# Altium footprint library myLib.PcbLib: 58 footprints (part 4 of 4)
Each footprint in its own frame and in the unit in brackets; x right, y up, seen from the top. Pads: shape width x height; smd on the part's side, far side on the other; paste and mask are expansions set on the pad; w line width, h text height; cw(c..) or ccw(c..) is an arc to the next point about the centre after c.
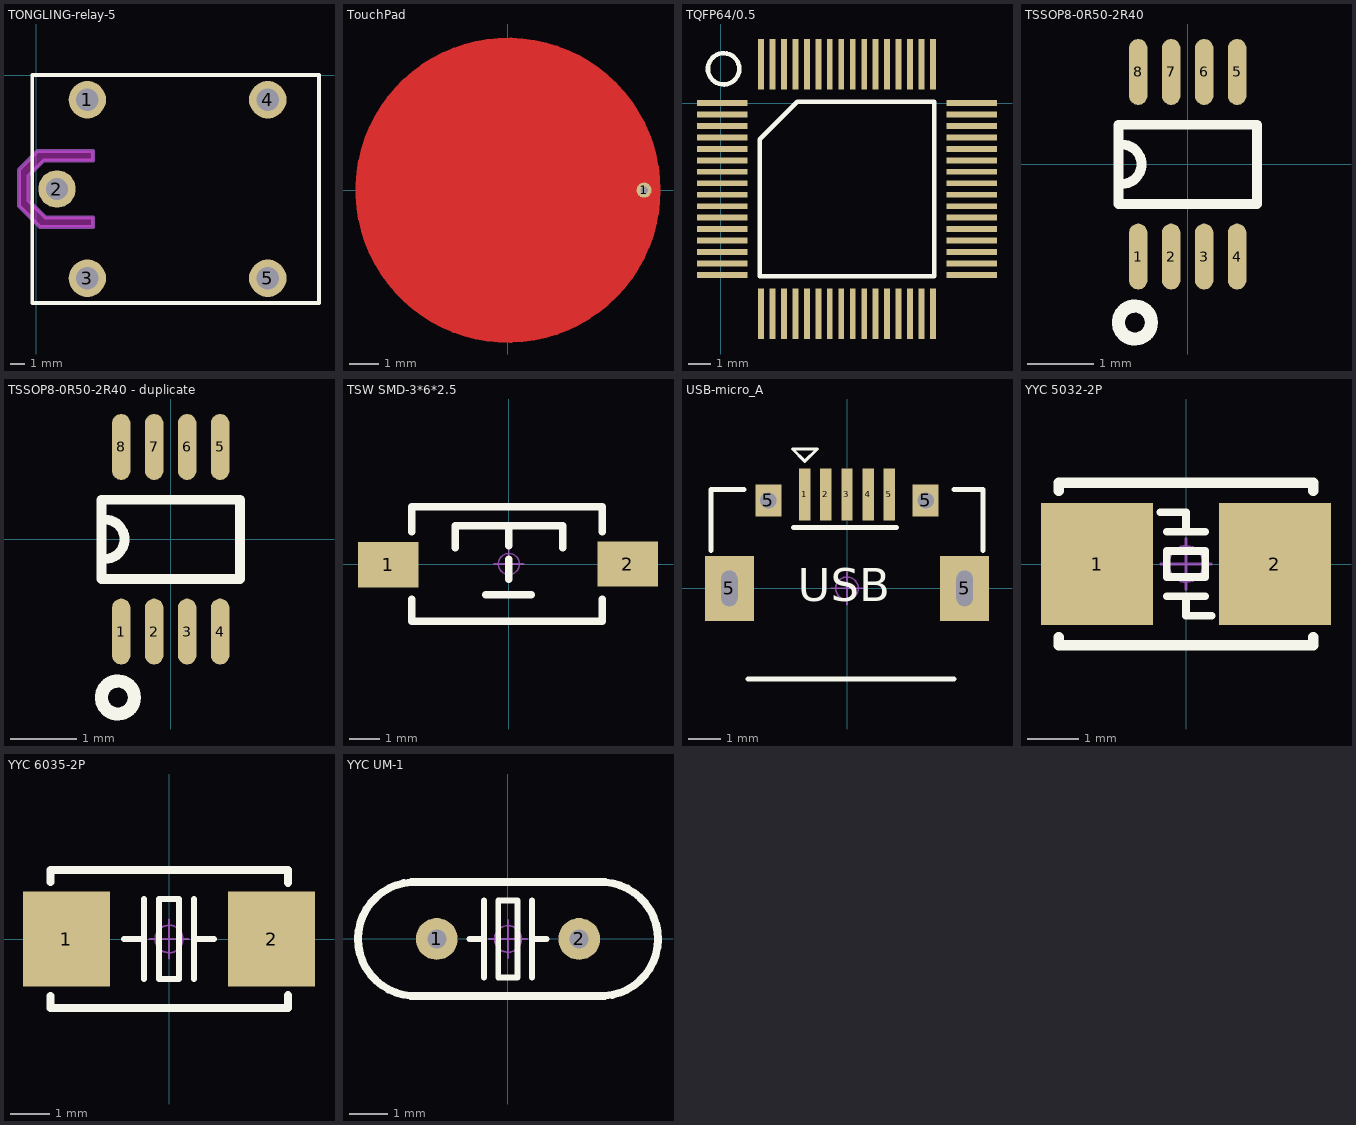
[diagram p3: the footprints below, top view; thin cyan lines are the x and y axes]

## TONGLING-relay-5 [mm]
pads (5):
  round 2.5 hole 1.5 mask+0.102: 1(3.429,-1.651) 2(1.397,-7.62) 3(3.429,-13.589) 4(15.494,-1.651) 5(15.494,-13.589)
Top Overlay:
  lines w0.254: -0.254,-15.24 18.923,-15.24 18.923,0 -0.254,0 -0.254,-15.24
Keep-Out Layer:
  board cut-out: 3.81,-5.08 0.103,-5.08 -1.143,-6.409 -1.143,-8.763 0.254,-10.16 3.81,-10.16 3.81,-9.525 0.635,-9.525 -0.508,-8.382 -0.508,-6.731 0.508,-5.715 3.81,-5.715
Mechanical 13:
  lines w0.254: 3.81,-10.16 0.254,-10.16 -1.143,-8.763 -1.143,-6.326 0.103,-5.08 3.81,-5.08 3.81,-5.715 ; 3.81,-10.16 3.81,-10.16 ; 3.81,-10.16 3.81,-9.525 ; 3.81,-9.525 3.81,-9.525 ; 3.81,-9.525 0.635,-9.525 -0.508,-8.382 -0.508,-6.731 0.508,-5.715 3.81,-5.715 ; 3.81,-5.715 3.81,-5.715
3D body "nff-NF8 3D 1CO PDF.STEP": height 15.3, standoff -3.9, extent -0.102,-15.306 18.898,0.194

## TouchPad [mil]
pads (1):
  round 20 hole 10: 1(180,0)
Top Layer:
  circle w10: c0,0 r196.85
  pour cut-out: 100,50
  region: -10,200 -35,195 -90,175 -145,135 -165,105 -195,45 -195,-40 -165,-105 -135,-145 -105,-165 -55,-190 30,-195 80,-180 135,-145 180,-85 196.85,-36.85 196.85,0 190,50 170,100 120,160 90,175 55,190

## TQFP64/0.5 [mm]
pads (64):
  rect 2.2x0.254 smd: 1(0.054,0.003) 2(0.054,-0.497) 3(0.054,-0.997) 4(0.054,-1.497) 5(0.054,-1.997) 6(0.054,-2.497) 7(0.054,-2.997) 8(0.054,-3.497) 9(0.054,-3.997) 10(0.054,-4.497) 11(0.054,-4.997) 12(0.054,-5.497) 13(0.054,-5.997) 14(0.054,-6.497) 15(0.054,-6.997) 16(0.054,-7.497) 33(10.954,-7.497) 34(10.954,-6.997) 35(10.954,-6.497) 36(10.954,-5.997) 37(10.954,-5.497) 38(10.954,-4.997) 39(10.954,-4.497) 40(10.954,-3.997) 41(10.954,-3.497) 42(10.954,-2.997) 43(10.954,-2.497) 44(10.954,-1.997) 45(10.954,-1.497) 46(10.954,-0.997) 47(10.954,-0.497) 48(10.954,0.003)
  rect 0.254x2.2 smd: 17(1.754,-9.197) 18(2.254,-9.197) 19(2.754,-9.197) 20(3.254,-9.197) 21(3.754,-9.197) 22(4.254,-9.197) 23(4.754,-9.197) 24(5.254,-9.197) 25(5.754,-9.197) 26(6.254,-9.197) 27(6.754,-9.197) 28(7.254,-9.197) 29(7.754,-9.197) 30(8.254,-9.197) 31(8.754,-9.197) 32(9.254,-9.197) 49(9.254,1.703) 50(8.754,1.703) 51(8.254,1.703) 52(7.754,1.703) 53(7.254,1.703) 54(6.754,1.703) 55(6.254,1.703) 56(5.754,1.703) 57(5.254,1.703) 58(4.754,1.703) 59(4.254,1.703) 60(3.754,1.703) 61(3.254,1.703) 62(2.754,1.703) 63(2.254,1.703) 64(1.754,1.703)
Top Overlay:
  circle w0.2: c0.116,1.5 r0.684
  lines w0.2: 1.689,-7.562 9.319,-7.562 9.319,0.068 3.324,0.068 1.689,-1.567 1.689,-7.562
3D body "TQFP64_0.5.STEP": height 1, standoff -0.05, extent -0.432,-9.684 11.468,2.216

## TSSOP8-0R50-2R40 [mm]
pads (8):
  oval 0.28x1 smd: 1(-0.75,-1.4) 2(-0.25,-1.4) 3(0.25,-1.4) 4(0.75,-1.4) 5(0.75,1.4) 6(0.25,1.4) 7(-0.25,1.4) 8(-0.75,1.4)
Top Overlay:
  circle w0.2: c-0.8,-2.4 r0.25
  lines w0.15: -1,-0.3 ccw(c-1,0) -1,0.3 ; -1.05,-0.6 -1.05,0.6 1.05,0.6 1.05,-0.6 -1.05,-0.6

## TSSOP8-0R50-2R40 - duplicate [mm]
pads (8):
  oval 0.28x1 smd: 1(-0.75,-1.4) 2(-0.25,-1.4) 3(0.25,-1.4) 4(0.75,-1.4) 5(0.75,1.4) 6(0.25,1.4) 7(-0.25,1.4) 8(-0.75,1.4)
Top Overlay:
  circle w0.2: c-0.8,-2.4 r0.25
  lines w0.15: -1,-0.3 ccw(c-1,0) -1,0.3 ; -1.05,-0.6 1.05,-0.6 1.05,0.6 -1.05,0.6 -1.05,-0.6

## TSW SMD-3*6*2.5 [mm] "3*6*2.5mm"
pads (2):
  rect 2x1.5 smd: 1(-3.996,-0.02) 2(3.937,0)
Top Overlay:
  lines w0.254: -3.212,-1.168 -3.212,-1.9 3.088,-1.9 3.088,-1.168 ; -3.212,1.067 -3.212,1.9 3.088,1.9 3.088,1.067 ; -1.778,0.533 -1.778,1.27 1.778,1.27 1.778,0.533 ; -0.762,-1.016 0.737,-1.016 ; 0,-0.508 0,0.152 ; 0,0.61 0,1.27
Mechanical 15:
  circle w0.05: c0,0 r0.35
  lines w0.05: -0.5,0 0.5,0 ; 0,-0.5 0,0.5
3D body "TSW SMD-3x6x2.5.STEP": height 2.59, standoff -0.03, extent -4,-1.877 4,1.623

## USB-micro_A [mm] "micro型USB ，5.7*7.8*2.5mm"
pads (9):
  rect 0.35x1.6 smd: 1(-1.3,2.9) 2(-0.65,2.9) 3(0,2.9) 4(0.65,2.9) 5(1.3,2.9)
  rect 1.5x2 hole 0.5 slot 1.1 at 90 deg: 5(-3.625,0) 5(3.625,0)
  rect 0.8x1 hole 0.5: 5(-2.425,2.71) 5(2.425,2.71)
Top Overlay:
  lines w0.1: -1.681,4.297 -1.3,3.916 -0.919,4.297 -1.681,4.297
  lines w0.152: -4.191,1.168 -4.191,3.048 -3.175,3.048 ; -3.048,-2.794 3.302,-2.794 ; -1.65,1.875 1.525,1.875 ; 3.302,3.048 4.191,3.048 4.191,1.168
  text "USB" at -1.524,-0.402 h1.02
Mechanical 15:
  circle w0.05: c0,0 r0.35
  lines w0.05: -0.5,0 0.5,0 ; 0,-0.5 0,0.5
3D body "USB micro_A.STEP": height 2.8, standoff -0.95, extent -4.001,-2.71 4.001,2.89

## YYC 5032-2P [mm] "5mm*3.2mm*0.8mm(长*宽*高)"
pads (2):
  rect 2.2x2.4 smd: 1(-1.75,0) 2(1.75,0)
Top Overlay:
  lines w0.152: -0.508,1.016 0,1.016 0,0.635 ; -0.381,-0.635 0.381,-0.635 ; -0.381,0.635 0.381,0.635 ; 0,-0.635 0,-1.016 0.381,-1.016 0.508,-1.016 ; -0.381,-0.254 0.381,-0.254 0.381,0.254 -0.381,0.254 -0.381,-0.254
  lines w0.203: -2.5,-1.437 -2.5,-1.6 2.5,-1.6 2.5,-1.437 ; -2.5,1.437 -2.5,1.6 2.5,1.6 2.5,1.437
Mechanical 15:
  circle w0.05: c0,0 r0.35
  lines w0.05: -0.5,0 0.5,0 ; 0,-0.5 0,0.5
3D body "OSC 5032-2.STEP": height 0.86, standoff 0.04, extent -2.5,-1.6 2.5,1.6

## YYC 6035-2P [mm] "6mm*3.5mm*1mm(长*宽*高)"
pads (2):
  rect 2.2x2.4 smd: 1(-2.6,0) 2(2.6,0)
Top Overlay:
  lines w0.152: -1.143,0 -0.635,0 ; -0.635,-1.016 -0.635,1.016 ; 0.635,-1.016 0.635,1.016 ; 0.635,0 1.143,0 ; -0.254,-1.016 -0.254,1.016 0.254,1.016 0.254,-1.016 -0.254,-1.016
  lines w0.203: -3,-1.445 -3,-1.75 3.02,-1.75 3.02,-1.425 ; -3,1.445 -3,1.75 3.02,1.75 3.02,1.425
Mechanical 15:
  circle w0.05: c0,0 r0.35
  lines w0.05: -0.5,0 0.5,0 ; 0,-0.5 0,0.5
3D body "OSC 6035-2.STEP": height 1.06, standoff 0.04, extent -3,-1.75 3,1.75

## YYC UM-1 [mm]
pads (2):
  round 1.1 hole 0.5: 1(-1.875,0) 2(1.875,0)
Top Overlay:
  lines w0.152: -1.016,0 -0.635,0 ; -0.635,-1.016 -0.635,1.016 ; 0.635,-1.016 0.635,1.016 ; 0.635,0 1.016,0 ; -0.254,-1.016 0.254,-1.016 0.254,1.016 -0.254,1.016 -0.254,-1.016
  lines w0.203: -2.556,-1.5 2.54,-1.5 ccw(c2.452,-0.003) 2.558,1.493 ; -2.556,-1.496 cw(c-2.45,0) -2.538,1.497 ; -2.538,1.5 2.558,1.5
Mechanical 15:
  circle w0.05: c0,0 r0.35
  lines w0.05: -0.5,0 0.5,0 ; 0,-0.5 0,0.5